# Altium footprint library COOP4403_FULL.PcbLib: 52 footprints (part 2 of 4)
Each footprint in its own frame and in the unit in brackets; x right, y up, seen from the top. Pads: shape width x height; smd on the part's side, far side on the other; paste and mask are expansions set on the pad; w line width, h text height; cw(c..) or ccw(c..) is an arc to the next point about the centre after c.
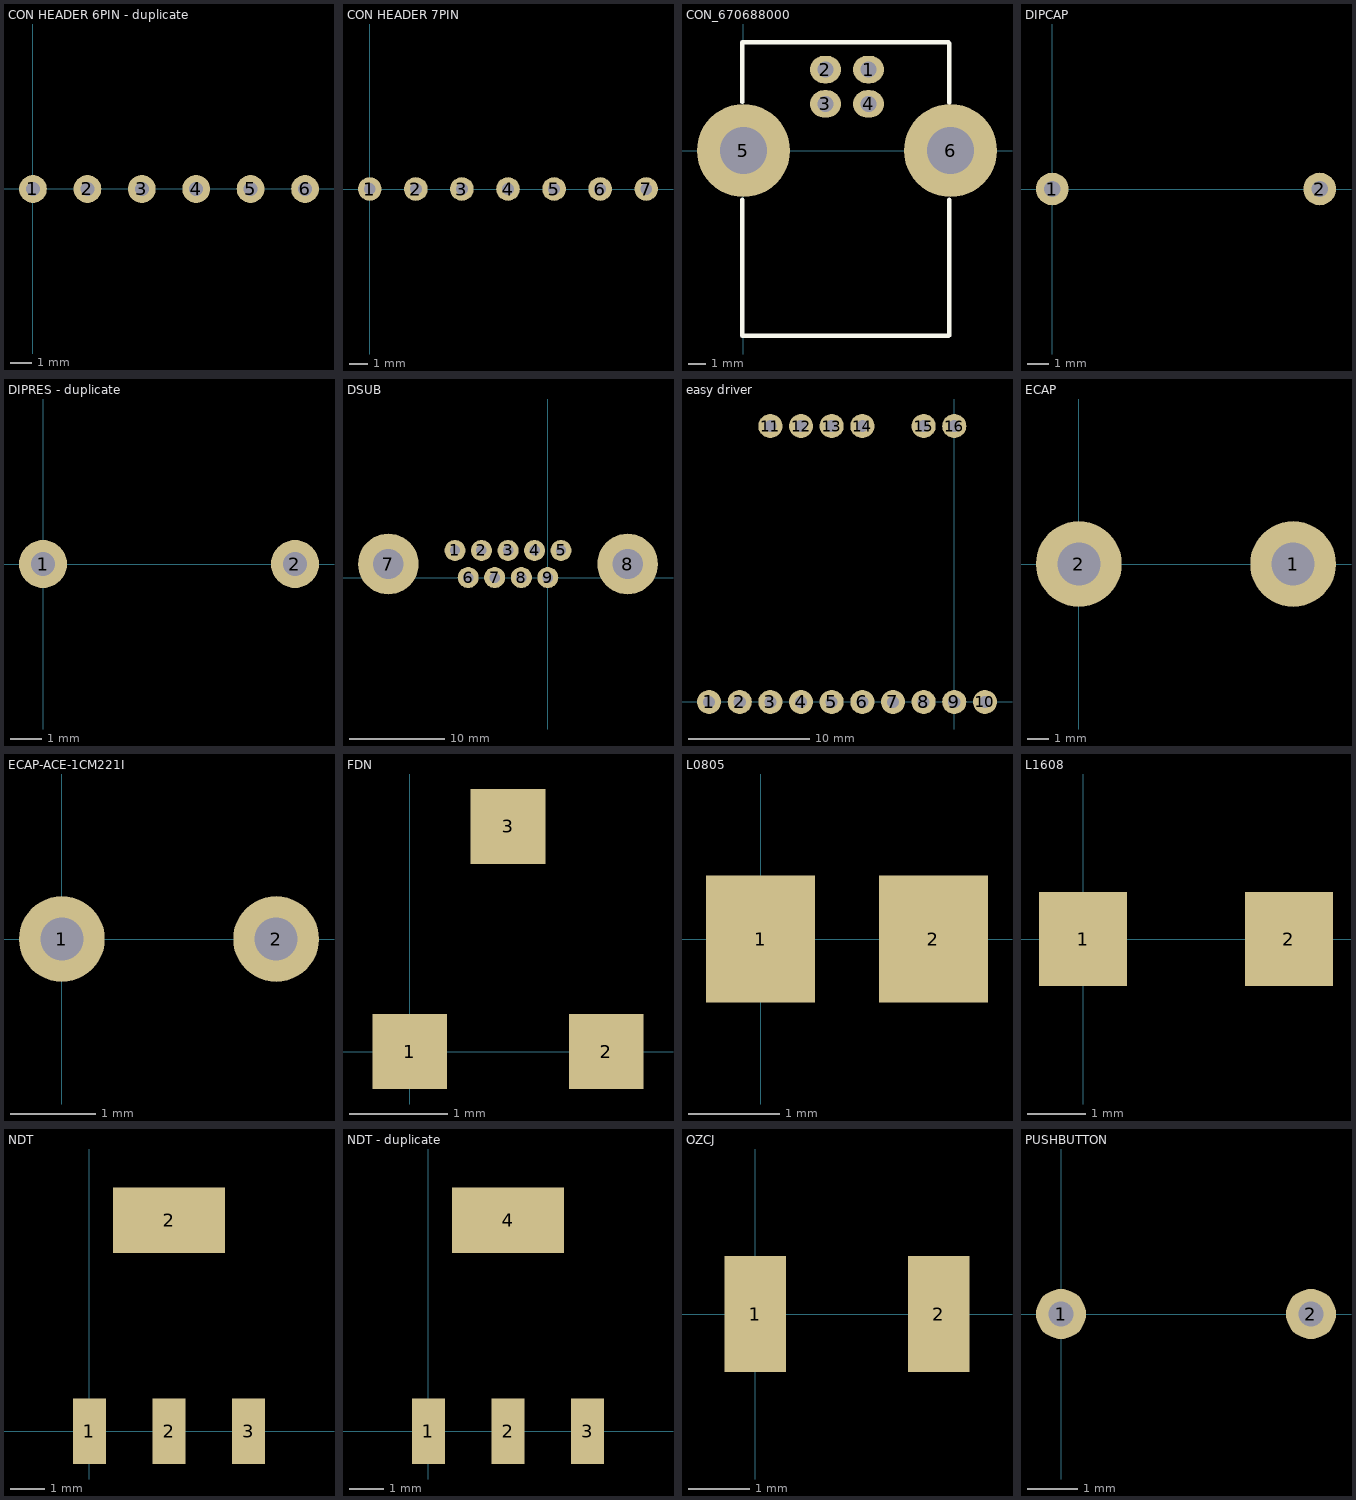
[diagram p1: the footprints below, top view; thin cyan lines are the x and y axes]

## CON HEADER 6PIN - duplicate [mm]
pads (6):
  round 1.28 hole 0.64: 1(0,0) 2(2.5,0) 3(5,0) 4(7.5,0) 5(10,0) 6(12.5,0)
3D body "SW3dPS-jst-b6b-xh-a.STEP": height 3.2, standoff -7.2, extent -2.414,-3.51 14.986,2.24

## CON HEADER 7PIN [mm]
pads (7):
  round 1.28 hole 0.64: 1(0,0) 2(2.5,0) 3(5,0) 4(7.5,0) 5(10,0) 6(12.5,0) 7(15,0)
3D body "User Library-B7B-XH-A.step": height 2.4, standoff -8, extent -2.45,-3.4 17.45,2.35

## CON_670688000 [mm] "CONN USB RT ANG RECPT TYPE B BLK"
pads (6):
  oval 1.8x1.6 hole 0.92: 1(7.27,4.71) 2(4.77,4.71) 3(4.77,2.71) 4(7.27,2.71)
  round 5.4 hole 2.71: 5(0,0) 6(12.04,0)
Top Overlay:
  lines w0.254: -0.076,-2.87 -0.076,-10.77 11.924,-10.77 ; -0.076,2.819 -0.076,6.299 11.924,6.299 ; 11.963,-10.752 11.963,-2.87 ; 11.963,2.769 11.963,6.248
3D body "14389.stp": height 10.7, standoff -3.95, extent -1.524,-10.485 13.376,6.015

## DIPCAP [mil]
pads (2):
  round 60 hole 30: 1(0,0) 2(492.13,0)
3D body: height 203.23, standoff -108.97, extent 0,0 0,0

## DIPRES - duplicate [mil]
pads (2):
  round 60 hole 30: 1(0,0) 2(314.96,0)

## DSUB [mm]
pads (11):
  round 2.2 hole 1.09: 1(-9.719,2.84) 2(-6.949,2.84) 3(-4.155,2.84) 4(-1.385,2.84) 5(1.385,2.84) 6(-8.334,0) 7(-5.564,0) 8(-2.77,0) 9(0,0)
  round 6.36 hole 3.18: 7(-16.699,1.42) 8(8.365,1.42)
3D body "SW3dPS-Connector, D-Sub, 9 pin, RA, Receptacle.STEP": height 12.55, standoff -3.99, extent -19.38,-14.351 11.506,3.988

## easy driver [mm]
pads (16):
  round 2 hole 1: 1(-20.32,0) 2(-17.78,0) 3(-15.24,0) 4(-12.7,0) 5(-10.16,0) 6(-7.62,0) 7(-5.08,0) 8(-2.54,0) 9(0,0) 10(2.54,0) 11(-15.24,22.86) 12(-12.7,22.86) 13(-10.16,22.86) 14(-7.62,22.86) 15(-2.54,22.86) 16(0,22.86)

## ECAP [mm]
pads (2):
  round 4 hole 2: 1(10,0) 2(0,0)

## ECAP-ACE-1CM221I [mm] "CAP ALUM 220uF %20 16V Radial"
pads (2):
  round 1 hole 0.5: 1(0,0) 2(2.5,0)
3D body "SW3dPS-capacitor-3.STEP": height 11, standoff -11, extent -3.388,-4.531 5.522,4.379

## FDN [mm]
pads (3):
  rect 0.76x0.76 smd: 1(0,0) 2(2,0) 3(1,2.29)
3D body "SW3DPS-SOT-23-DEFAULT.STEP": height 1.05, standoff -0.05, extent -0.509,-0.082 2.491,2.418

## L0805 [mm]
pads (2):
  rect 1.2x1.4 smd: 1(0,0) 2(1.9,0)

## L1608 [mm]
pads (2):
  rect 1.5x1.6 smd: 1(0,0) 2(3.5,0)

## NDT [mm]
pads (4):
  rect 0.95x1.9 smd: 1(0,0) 2(2.3,0) 3(4.6,0)
  rect 3.25x1.9 smd: 2(2.3,6.1)

## NDT - duplicate [mm]
pads (4):
  rect 0.95x1.9 smd: 1(0,0) 2(2.3,0) 3(4.6,0)
  rect 3.25x1.9 smd: 4(2.3,6.1)

## OZCJ [mm]
pads (2):
  rect 1x1.9 smd: 1(0,0) 2(3,0)
3D body "User Library-FUSER_nanoSMD.STEP": height 1, standoff 0, extent -0.053,-0.749 3.152,0.851

## PUSHBUTTON [mm]
pads (2):
  round 1 hole 0.5: 1(0,0) 2(5,0)
3D body "b3f-6000.stp": height 4.3, standoff -14, extent -0.46,-3 5.54,3.2